# Altium footprint library PcbLib1.PcbLib: 81 footprints (part 6 of 6)
Each footprint in its own frame and in the unit in brackets; x right, y up, seen from the top. Pads: shape width x height; smd on the part's side, far side on the other; paste and mask are expansions set on the pad; w line width, h text height; cw(c..) or ccw(c..) is an arc to the next point about the centre after c.
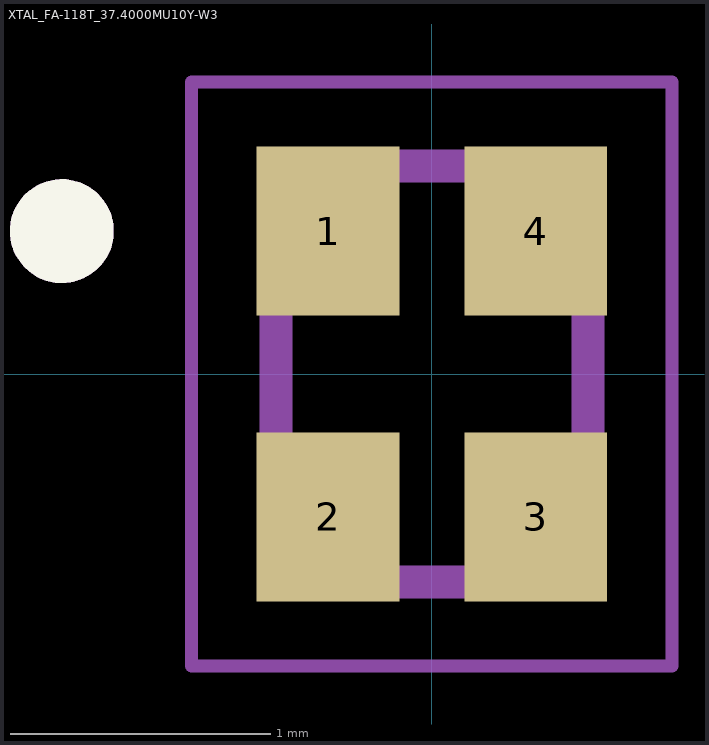
[diagram p5: the footprint, top view; thin cyan lines are the x and y axes]

## XTAL_FA-118T_37.4000MU10Y-W3 [mm]
height 0.35
pads (4):
  rect 0.55x0.65 smd: 1(-0.4,0.55) 2(-0.4,-0.55) 3(0.4,-0.55) 4(0.4,0.55)
Top Overlay:
  circle w0.2: c-1.425,0.55 r0.1
Mechanical 13:
  circle w0.2: c-1.425,0.55 r0.1
  lines w0.127: -0.6,-0.8 0.6,-0.8 0.6,0.8 -0.6,0.8 -0.6,-0.8
Mechanical 15:
  lines w0.05: -0.925,-1.125 0.925,-1.125 0.925,1.125 -0.925,1.125 -0.925,-1.125
3D body "step_temp.STEP": height 0.35, standoff 0, extent -0.6,-0.8 0.6,0.8